# Altium footprint library Connectors Pad Lib.PcbLib: 70 footprints (part 5 of 5)
Each footprint in its own frame and in the unit in brackets; x right, y up, seen from the top. Pads: shape width x height; smd on the part's side, far side on the other; paste and mask are expansions set on the pad; w line width, h text height; cw(c..) or ccw(c..) is an arc to the next point about the centre after c.
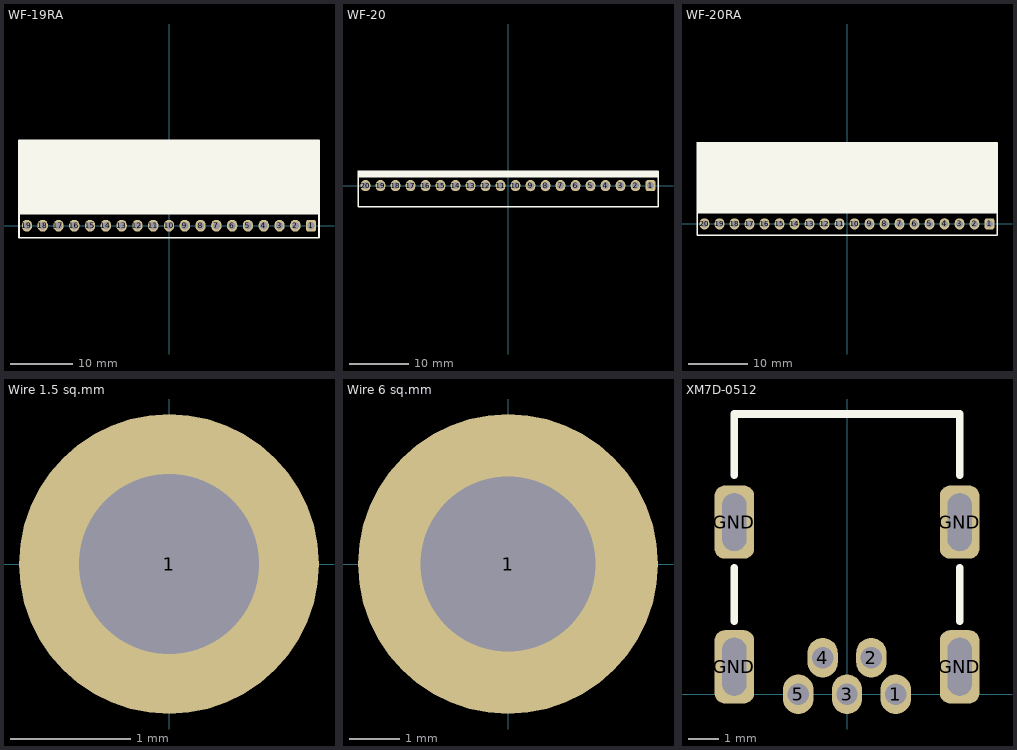
[diagram p4: the footprints below, top view; thin cyan lines are the x and y axes]

## WF-19RA [mil] "PCB Rigth Angle Connector 19-Pin"
pads (19):
  rrect50% 65x75 hole 45: 1(900,0)
  oval 65x75 hole 45: 2(800,0) 3(700,0) 4(600,0) 5(500,0) 6(400,0) 7(300,0) 8(200,0) 9(100,0) 10(0,0) 11(-100,0) 12(-200,0) 13(-300,0) 14(-400,0) 15(-500,0) 16(-600,0) 17(-700,0) 18(-800,0) 19(-900,0)
Top Overlay:
  rectangle: -950,75 950,540
  lines w10: -950,75 950,75 ; -950,-75 950,-75 950,540 -950,540 -950,-75
3D body "DS1070-19MR (WF-19RA CONNFLY).step": height 233.28, standoff -132.86, extent -950,-14.8 950,540.31

## WF-20 [mil] "PCB Vertical Connector 20-Pin"
pads (20):
  rrect50% 65x75 hole 45: 1(950,0)
  oval 65x75 hole 45: 2(850,0) 3(750,0) 4(650,0) 5(550,0) 6(450,0) 7(350,0) 8(250,0) 9(150,0) 10(50,0) 11(-50,0) 12(-150,0) 13(-250,0) 14(-350,0) 15(-450,0) 16(-550,0) 17(-650,0) 18(-750,0) 19(-850,0) 20(-950,0)
Top Overlay:
  rectangle: -1000,60 1000,95
  lines w10: -1000,60 1000,60 ; -1000,-140 -1000,95 1000,95 1000,-140 -1000,-140
3D body "DS1070-20 (WF-20 CONNFLY).step": height 449.82, standoff -128.92, extent -1000,-140 1000,92.28

## WF-20RA [mil] "PCB Rigth Angle Connector 20-Pin"
pads (20):
  rrect50% 65x75 hole 45: 1(950,0)
  oval 65x75 hole 45: 2(850,0) 3(750,0) 4(650,0) 5(550,0) 6(450,0) 7(350,0) 8(250,0) 9(150,0) 10(50,0) 11(-50,0) 12(-150,0) 13(-250,0) 14(-350,0) 15(-450,0) 16(-550,0) 17(-650,0) 18(-750,0) 19(-850,0) 20(-950,0)
Top Overlay:
  rectangle: -1000,75 1000,540
  lines w10: -1000,75 1000,75 ; -1000,-75 1000,-75 1000,540 -1000,540 -1000,-75
3D body "DS1070-20MR (WF-20RA CONNFLY).step": height 233.28, standoff -132.86, extent -1000,-14.8 1000,540.31

## Wire 1.5 sq.mm [mm] "Direct soldering hole of wire 1.5 sq.mm"
pads (1):
  round 2.5 hole 1.5: 1(0,0)

## Wire 6 sq.mm [mm] "Direct soldering hole of wire 6 sq.mm"
pads (1):
  round 6 hole 3.5: 1(0,0)

## XM7D-0512 [mm] "USB-mini"
pads (9):
  oval 1x1.3 hole 0.7: 1(1.6,0) 2(0.8,1.2) 3(0,0) 4(-0.8,1.2) 5(-1.6,0)
  rrect50% 1.3x2.4 hole 1.9 slot 0.8 at 0 deg: GND(-3.7,0.9) GND(-3.7,5.65) GND(3.7,0.9) GND(3.7,5.65)
Top Overlay:
  lines w0.254: -3.7,2.4 -3.7,4.15 ; -3.7,7.2 -3.7,9.2 3.7,9.2 3.7,7.2 ; 3.7,2.4 3.7,4.15